# Altium footprint library Semiconductor.PcbLib: 73 footprints (part 5 of 5)
Each footprint in its own frame and in the unit in brackets; x right, y up, seen from the top. Pads: shape width x height; smd on the part's side, far side on the other; paste and mask are expansions set on the pad; w line width, h text height; cw(c..) or ccw(c..) is an arc to the next point about the centre after c.
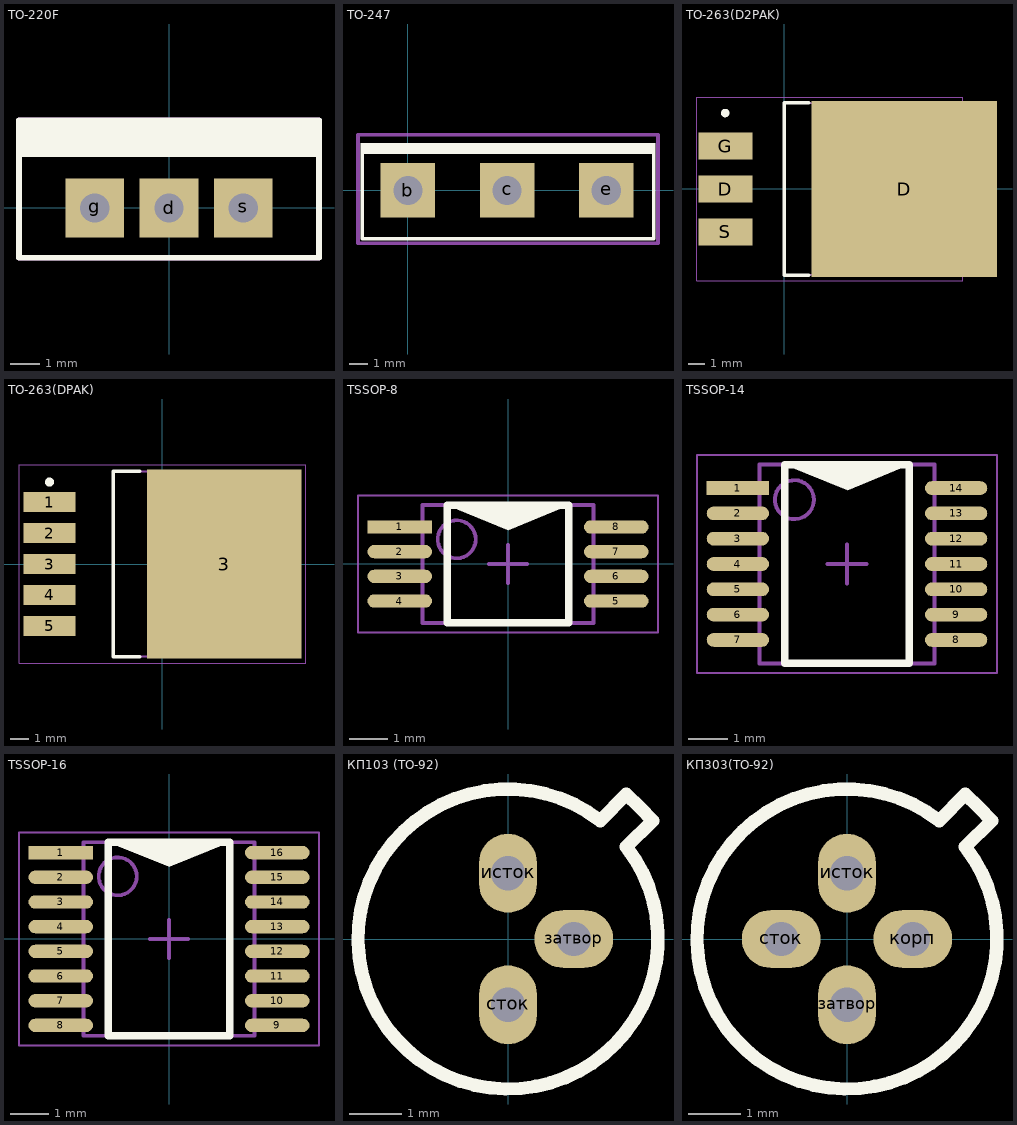
[diagram p4: the footprints below, top view; thin cyan lines are the x and y axes]

## TO-220F [mm] "Два выпрямительных скоростных диода в корпусе TO-220"
pads (3):
  rect 2x2 hole 1: d(0,0) g(-2.54,0) s(2.54,0)
Top Overlay:
  rectangle: -5.125,1.75 5.125,3
  lines w0.2: -5.125,-1.702 -5.125,3 5.125,3 5.125,-1.702 -5.125,-1.702
Mechanical 15:
  lines w0.2: -5.125,-1.702 -5.125,3 5.125,3 5.125,-1.702 -5.125,-1.702
3D body: height 19.37, standoff -9.48, extent -5.08,-1.69 5.061,3.01

## TO-247 [mm]
pads (3):
  rect 3x3 hole 1.6: b(0,0) c(5.45,0) e(10.9,0)
Top Overlay:
  rectangle: -2.616,2 13.614,2.591
  lines w0.2: -2.515,-2.667 13.513,-2.667 13.513,2.515 -2.515,2.515 -2.515,-2.667
Mechanical 15:
  lines w0.2: -2.743,-2.896 13.741,-2.896 13.741,3.048 -2.743,3.048 -2.743,-2.896
3D body: height 30.05, standoff -11.35, extent -2.539,-2.225 13.461,2.775

## TO-263(D2PAK) [mm]
height 4.65
pads (4):
  rect 3.2x1.6 smd: D(-3.5,0) G(-3.5,2.54) S(-3.5,-2.54)
  rect 11x10.4 smd: D(7.1,0)
Top Overlay:
  circle w0.25: c-3.5,4.5 r0.125
  lines w0.2: 1.45,-5.1 0,-5.1 0,5.1 1.45,5.1
Mechanical 13:
  lines w0.1: 0,-5.075 0,5.075 8.64,5.075 8.64,-5.075 0,-5.075
Mechanical 15:
  lines w0.05: -5.175,-5.45 -5.175,5.45 10.575,5.45 10.575,-5.45 -5.175,-5.45
  lines w0.1: 2.2,0 3.2,0 ; 2.7,-0.5 2.7,0.5
3D body: height 4.69, standoff 0, extent -3.83,-5.08 11.61,5.08

## TO-263(DPAK) [mm] "D2-PAK, 6-Pads, Body 7,42x8,44mm (max), IPC Medium Density"
height 4.65
pads (6):
  rect 2.85x1.1 smd: 1(-6.2,3.4) 2(-6.2,1.7) 3(-6.2,0) 4(-6.2,-1.7) 5(-6.2,-3.4)
  rect 8.5x10.4 smd: 3(3.4,0)
Top Overlay:
  circle w0.25: c-6.2,4.5 r0.125
  lines w0.2: -1.25,-5.1 -2.7,-5.1 -2.7,5.1 -1.25,5.1
Mechanical 13:
  lines w0.1: -2.7,-5.075 -2.7,5.075 5.94,5.075 5.94,-5.075 -2.7,-5.075
Mechanical 15:
  lines w0.05: -7.875,-5.45 -7.875,5.45 7.875,5.45 7.875,-5.45 -7.875,-5.45
  lines w0.1: -0.5,0 0.5,0 ; 0,-0.5 0,0.5
3D body: height 4.56, standoff 0, extent -6.807,-5.08 7.207,5.08

## TSSOP-8 [mm] "TSOP, 8-Leads, Body 3,00x4,40mm, Pitch 0,65mm, IPC Medium Density"
height 1.2
pads (8):
  rect 1.7x0.35 smd: 1(-2.85,0.975)
  oval 1.7x0.35 smd: 2(-2.85,0.325) 3(-2.85,-0.325) 4(-2.85,-0.975) 5(2.85,-0.975) 6(2.85,-0.325) 7(2.85,0.325) 8(2.85,0.975)
Top Overlay:
  region: -1.6,1.55 1.6,1.55 0,0.889
  lines w0.2: -1.6,-1.55 1.6,-1.55 1.6,1.55 -1.6,1.55 -1.6,-1.55
Mechanical 13:
  circle w0.1: c-1.35,0.65 r0.5
  lines w0.1: -2.25,-1.55 2.25,-1.55 2.25,1.55 -2.25,1.55 -2.25,-1.55
Mechanical 15:
  lines w0.05: -3.95,-1.8 3.95,-1.8 3.95,1.8 -3.95,1.8 -3.95,-1.8
  lines w0.1: -0.5,0 0.5,0 ; 0,-0.5 0,0.5
3D body: height 1.2, standoff 0, extent -3.228,-1.5 3.228,1.5

## TSSOP-14 [mm] "TSOP, 14-Leads, Body 5,00x4,40mm, Pitch 0,65mm, IPC Medium Density"
height 0.95
pads (14):
  rect 1.6x0.35 smd: 1(-11.2,7.8)
  oval 1.6x0.35 smd: 2(-11.2,7.15) 3(-11.2,6.5) 4(-11.2,5.85) 5(-11.2,5.2) 6(-11.2,4.55) 7(-11.2,3.9) 8(-5.6,3.9) 9(-5.6,4.55) 10(-5.6,5.2) 11(-5.6,5.85) 12(-5.6,6.5) 13(-5.6,7.15) 14(-5.6,7.8)
Top Overlay:
  region: -10,8.4 -6.8,8.4 -8.382,7.747
  lines w0.2: -10,3.3 -6.8,3.3 -6.8,8.4 -10,8.4 -10,3.3
Mechanical 13:
  circle w0.1: c-9.75,7.5 r0.5
  lines w0.1: -10.65,3.3 -6.15,3.3 -6.15,8.4 -10.65,8.4 -10.65,3.3
Mechanical 15:
  lines w0.05: -12.25,3.05 -4.55,3.05 -4.55,8.65 -12.25,8.65 -12.25,3.05
  lines w0.1: -8.9,5.85 -7.9,5.85 ; -8.4,5.35 -8.4,6.35
3D body: height 1.2, standoff 0, extent -11.6,3.3 -5.2,8.4

## TSSOP-16 [mm] "TSOP, 16-Leads, Body 5,00x4,40mm, Pitch 0,65mm, IPC Medium Density"
height 1.2
pads (16):
  rect 1.7x0.35 smd: 1(-2.85,2.275)
  oval 1.7x0.35 smd: 2(-2.85,1.625) 3(-2.85,0.975) 4(-2.85,0.325) 5(-2.85,-0.325) 6(-2.85,-0.975) 7(-2.85,-1.625) 8(-2.85,-2.275) 9(2.85,-2.275) 10(2.85,-1.625) 11(2.85,-0.975) 12(2.85,-0.325) 13(2.85,0.325) 14(2.85,0.975) 15(2.85,1.625) 16(2.85,2.275)
Top Overlay:
  region: -1.6,2.55 1.6,2.55 0,1.905
  lines w0.2: -1.6,-2.55 1.6,-2.55 1.6,2.55 -1.6,2.55 -1.6,-2.55
Mechanical 13:
  circle w0.1: c-1.35,1.65 r0.5
  lines w0.1: -2.25,-2.55 2.25,-2.55 2.25,2.55 -2.25,2.55 -2.25,-2.55
Mechanical 15:
  lines w0.05: -3.95,-2.8 3.95,-2.8 3.95,2.8 -3.95,2.8 -3.95,-2.8
  lines w0.1: -0.5,0 0.5,0 ; 0,-0.5 0,0.5
3D body: height 1, standoff 0, extent -3.2,-2.5 3.2,2.5

## КП103 (TO-92) [mm]
pads (3):
  oval 1.5x1.1 hole 0.65: затвор(1.25,0)
  oval 1.1x1.5 hole 0.65: исток(0,1.25) сток(0,-1.25)
Top Overlay:
  lines w0.254: 1.75,2.25 ccw(c0,0) 2.25,1.75 2.75,2.25 2.505,2.505 2.25,2.75 1.75,2.25

## КП303(TO-92) [mm]
pads (4):
  oval 1.1x1.5 hole 0.65: затвор(0,-1.25) исток(0,1.25)
  oval 1.5x1.1 hole 0.65: корп(1.25,0) сток(-1.25,0)
Top Overlay:
  lines w0.254: 1.75,2.25 ccw(c0,0) 2.25,1.75 2.75,2.25 2.505,2.505 2.25,2.75 1.75,2.25